# Altium footprint library pcb2D3D库101.PcbLib: 411 footprints (part 7 of 26)
Each footprint in its own frame and in the unit in brackets; x right, y up, seen from the top. Pads: shape width x height; smd on the part's side, far side on the other; paste and mask are expansions set on the pad; w line width, h text height; cw(c..) or ccw(c..) is an arc to the next point about the centre after c.
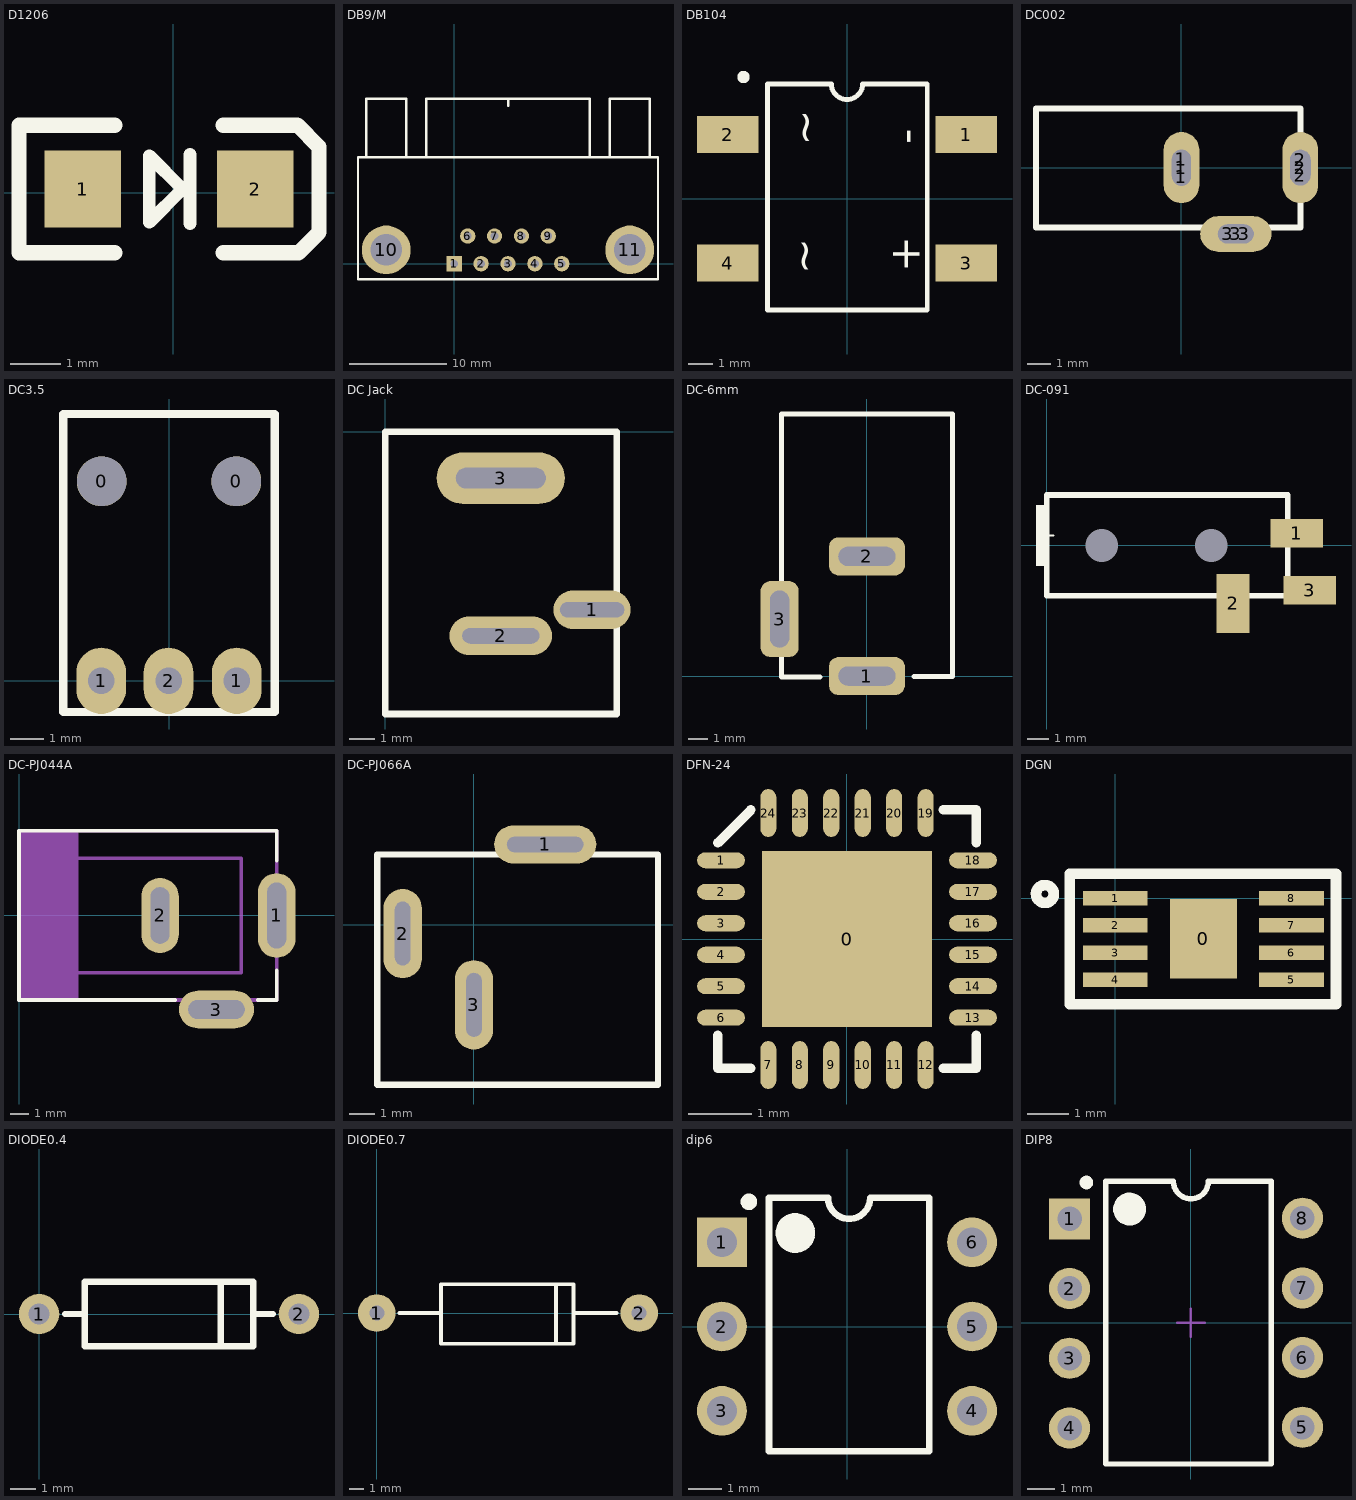
[diagram p6: the footprints below, top view; thin cyan lines are the x and y axes]

## D1206 [mil] "1/4W"
pads (2):
  rect 60x60 smd: 1(-71,3) 2(64,3)
TopOverlay:
  lines w10: 13,-24 13,30 ; -19,-23 -19,-12 -19,29 7,3 -19,-23
  lines w12: -46,-47 -121,-47 -121,53 -46,53 ; 39,-47 98,-47 114,-31 114,36 97,53 39,53
3D body "SOD-80.STEP": height 59.06, standoff 0, extent -72.9,-26.53 64.9,32.53

## DB9/M [mm]
pads (11):
  rect 1.575x1.575 hole 0.8: 1(0,0)
  round 1.575 hole 0.8: 2(2.76,0) 3(5.52,0) 4(8.28,0) 5(11.04,0) 6(1.38,2.84) 7(4.14,2.84) 8(6.9,2.84) 9(9.66,2.84)
  round 5 hole 3.25: 10(-6.98,1.42) 11(18.02,1.42)
TopOverlay:
  lines w0.254: -9.05,10.92 -9.05,16.92 -4.94,16.92 ; -4.91,10.92 -4.91,16.92 ; -2.85,10.92 -2.85,16.92 13.9,16.92 13.9,10.92 ; 5.525,16.2 5.525,16.9 ; 15.95,10.92 15.95,16.92 20.06,16.92 ; 20.09,10.92 20.09,16.92 ; -9.88,-1.58 20.92,-1.58 20.92,10.92 -9.88,10.92 -9.88,-1.58
3D body "SW3dPS-9-PIN_DSUB-1.STEP": height 12.81, standoff -2.91, extent -9.925,-2.012 20.885,17.063

## DB104 [mm] "光耦（未加焊）"
height 5.6
pads (4):
  rect 2.5x1.5 smd: 1(4.826,2.604) 2(-4.826,2.604) 3(4.826,-2.603) 4(-4.826,-2.603)
TopOverlay:
  circle w0.25: c-4.191,4.935 r0.125
  lines w0.2: 0.635,4.661 cw(c0,4.661) -0.635,4.661 -3.226,4.661 -3.226,-4.496 3.251,-4.496 3.251,4.661 0.711,4.661
  text "+" at 2.946,-2.972 h1.27
  text "-" at 2.997,2.21 h1.27
  text "~" at -1.118,2.159 h1.27
  text "~" at -1.168,-3.048 h1.27
3D body "User Library-DFS.STEP": height 2.61, standoff 0.02, extent -5.125,-4.111 5.175,4.089

## DC002 [mm]
pads (9):
  round 1.5 hole 0.8: 1(0,-0.381) 1(0,0.356) 2(5.004,-0.33) 2(5.004,0.33) 3(1.956,-2.794) 3(2.642,-2.794)
  oval 1.5x3 hole 0.8 slot 1.5 at 90 deg: 1(0,0)
  oval 1.5x3 hole 0.86 slot 1.5 at 90 deg: 2(5.004,0)
  oval 3x1.5 hole 0.8 slot 1.5 at 0 deg: 3(2.286,-2.794)
TopOverlay:
  lines w0.254: -6.121,-2.515 -6.121,2.489 5.004,2.489 5.004,-2.515 -6.121,-2.515
3D body "pj-018.stp": height 7.4, standoff -3.2, extent -6.257,-2.962 5.343,2.438

## DC3.5 [mm] "3.5A"
pads (5):
  round 1.5 hole 1.5: 0(-2.032,6.02) 0(2.032,6.02)
  oval 1.5x2 hole 0.8: 1(-2.045,0) 1(2.045,0) 2(-0.013,0)
TopOverlay:
  lines w0.254: -3.188,-0.94 -3.188,8.052 3.188,8.052 3.188,-0.94 -3.188,-0.94
3D body "pj-036dh.stp": height 5, standoff -3, extent -3,-1.016 3,7.984

## DC Jack [mm]
pads (3):
  oval 3x1.5 hole 0.6 slot 2.5 at 0 deg: 1(8.052,-6.934)
  oval 4x1.5 hole 0.6 slot 3 at 0 deg: 2(4.496,-7.95)
  oval 5x2 hole 0.8 slot 3.5 at 0 deg: 3(4.496,-1.803)
TopOverlay:
  lines w0.254: 0,-10.998 9.017,-10.998 9.017,0 0,0 0,-10.998
3D body "pj-044a.stp": height 14, standoff -3.2, extent 0.021,-10.949 9.021,0.051

## DC-6mm [mm]
pads (3):
  rrect50% 4x2 hole 1 slot 3 at 0 deg: 1(0,0) 2(0,6.3)
  rrect50% 2x4 hole 1 slot 3 at 90 deg: 3(-4.6,3)
TopOverlay:
  lines w0.254: -4.5,1 -4.5,-0.043 -2.457,-0.043 ; -4.5,5 -4.5,13.8 4.5,13.8 4.5,-0.018 2.482,-0.018
3D body "User Library-dc range - dc connector[4840_2201].STEP": height 11.02, standoff -3.48, extent -5.003,-0.043 4.503,13.783

## DC-091 [mm]
pads (5):
  round 0 hole 1.5 mask+0: 0(2.5,0) 0(7.5,0)
  rect 2.4x1.3 smd: 1(11.4,0.55) 3(12,-2.05)
  rect 1.5x2.7 smd: 2(8.5,-2.65)
TopOverlay:
  rectangle: -0.5,-0.95 0.1,1.85
  lines w0.1: -0.2,0.45 0.3,0.45
  lines w0.254: 0,-2.3 11,-2.3 11,2.3 0,2.3 0,-2.3
3D body "DC.STEP": height 4.4, standoff -0.8, extent 0.025,-3.875 12.625,2.425

## DC-PJ044A [mm]
pads (3):
  oval 2x4.5 hole 1 slot 3.5 at 90 deg: 1(13.7,0)
  oval 2x4 hole 1 slot 3 at 90 deg: 2(7.5,0)
  oval 4x2 hole 1 slot 3 at 0 deg: 3(10.5,-5)
TopOverlay:
  lines w0.2: 8.3,-4.5 0,-4.5 0,4.5 13.7,4.5 13.7,2.917 ; 12.7,-4.5 13.7,-4.5 13.7,-2.917
Mechanical7:
  rectangle: 0,-4.5 3.175,4.5
  lines w0.2: 0,-3.048 11.811,-3.048 11.811,3.048 0,3.048 ; 0,-4.5 0,4.5 13.7,4.5 13.7,-4.5 12.7,-4.5 0,-4.5
  lines w1: 7.5,-1 7.5,1 ; 9.5,-5 11.5,-5 ; 13.7,-1.2 13.7,1.2
3D body "Power Jack - TSH-3655-PBT-T.stp": height 11, standoff -3.5, extent -0.149,-5.004 14.351,4.496

## DC-PJ066A [mm]
pads (3):
  oval 4x1.5 hole 0.6 slot 3 at 0 deg: 1(2.794,3.143)
  oval 1.5x3.5 hole 0.6 slot 2.5 at 90 deg: 2(-2.794,-0.349) 3(0,-3.143)
TopOverlay:
  lines w0.254: -3.785,-6.267 7.214,-6.267 7.214,2.75 -3.785,2.75 -3.785,-6.267
3D body "pj-006a.stp": height 13.2, standoff -4.8, extent -3.657,-6.096 7.043,2.604

## DFN-24 [mm]
pads (25):
  rect 2.7x2.8 smd: 0(0,0)
  oval 0.762x0.254 smd: 1(-2,1.25) 2(-2,0.75) 3(-2,0.25) 4(-2,-0.25) 5(-2,-0.75) 6(-2,-1.25) 13(2,-1.25) 14(2,-0.75) 15(2,-0.25) 16(2,0.25) 17(2,0.75) 18(2,1.25)
  oval 0.254x0.762 smd: 7(-1.25,-2) 8(-0.75,-2) 9(-0.25,-2) 10(0.25,-2) 11(0.75,-2) 12(1.25,-2) 19(1.25,2) 20(0.75,2) 21(0.25,2) 22(-0.25,2) 23(-0.75,2) 24(-1.25,2)
TopOverlay:
  lines w0.152: -2.05,-1.525 -2.05,-2.05 -1.525,-2.05 ; -2.05,1.525 -1.525,2.05 ; 1.525,-2.05 2.05,-2.05 2.05,-1.525 ; 1.525,2.05 2.05,2.05 2.05,1.525
Mechanical15:
  lines w0.1: -0.5,0 0.5,0 ; 0,-0.5 0,0.5
3D body "QFN-24.STEP": height 0.95, standoff 0, extent -2.055,-2.06 2.045,2.04

## DGN [mm]
pads (9):
  rect 1.6x1.9 smd: 0(2.108,-0.965)
  rect 1.55x0.35 smd: 1(0,0) 2(0,-0.65) 3(0,-1.3) 4(0,-1.95) 5(4.216,-1.95) 6(4.216,-1.3) 7(4.216,-0.65) 8(4.216,0)
TopOverlay:
  lines w0.254: -1.518,0.233 ccw(c-1.686,0.102) -1.509,0.222 ; -1.092,-2.54 -1.092,0.584 5.283,0.584 5.283,-2.54 -1.092,-2.54
3D body "SW3dPS-MSOP8.STEP": height 1.05, standoff -0.05, extent -0.335,-2.54 4.602,0.56

## DIODE0.4 [mil]
pads (2):
  round 62 hole 32: 1(0,0) 2(400,0)
TopOverlay:
  lines w10: 40,0 70,0 ; 280,-50 280,50 ; 330,0 360,0 ; 70,-50 330,-50 330,50 70,50 70,-50
3D body "DO-41.STEP": height 58.74, standoff -149.92, extent -19.72,-53.36 415.71,49

## DIODE0.7 [mil]
pads (2):
  round 100 hole 40: 1(0,0) 2(700,0)
TopOverlay:
  lines w10: 60,0 170,0 ; 478,-82 478,77 ; 528,0 640,0 ; 171,-82 525,-82 525,77 171,77 171,-82
3D body "User Library-1N5353B.step": height 151.18, standoff -118.11, extent -17.85,-74.88 721.85,70

## dip6 [mm]
pads (6):
  rect 1.5x1.5 hole 0.9: 1(-3.772,2.54)
  round 1.5 hole 0.9: 2(-3.772,0) 3(-3.772,-2.54) 4(3.772,-2.54) 5(3.772,0) 6(3.772,2.54)
TopOverlay:
  circle w0.6: c-1.557,2.819 r0.3
  circle w0.25: c-2.957,3.759 r0.125
  lines w0.2: -2.349,-3.759 2.476,-3.759 2.476,3.88 0.699,3.88 cw(c0.064,3.88) -0.572,3.88 -2.349,3.88 -2.349,-3.759
3D body "DIP-6.STEP": height 4.31, standoff -3.28, extent -4.038,-3.991 3.962,4.089

## DIP8 [mm]
pads (8):
  rect 1.5x1.5 hole 0.9: 1(-4.42,3.785)
  round 1.5 hole 0.9: 2(-4.42,1.245) 3(-4.42,-1.295) 4(-4.42,-3.835) 5(4.064,-3.81) 6(4.064,-1.27) 7(4.064,1.27) 8(4.064,3.81)
TopOverlay:
  circle w0.6: c-2.235,4.14 r0.3
  circle w0.25: c-3.81,5.11 r0.125
  lines w0.2: -3.099,-5.15 2.921,-5.15 2.921,5.15 0.635,5.15 cw(c0,5.15) -0.635,5.15 -3.099,5.15 -3.099,-5.15
Mechanical15:
  lines w0.1: -0.5,0 0.5,0 ; 0,-0.5 0,0.5
3D body "DIP-8.STEP": height 3.65, standoff -3.71, extent -4.318,-4.953 4.064,4.953